# Altium schematic symbol library Analog Devices Data Converters Digital-to-Analog Converters.SchLib: 2231 symbols (part 108 of 135)
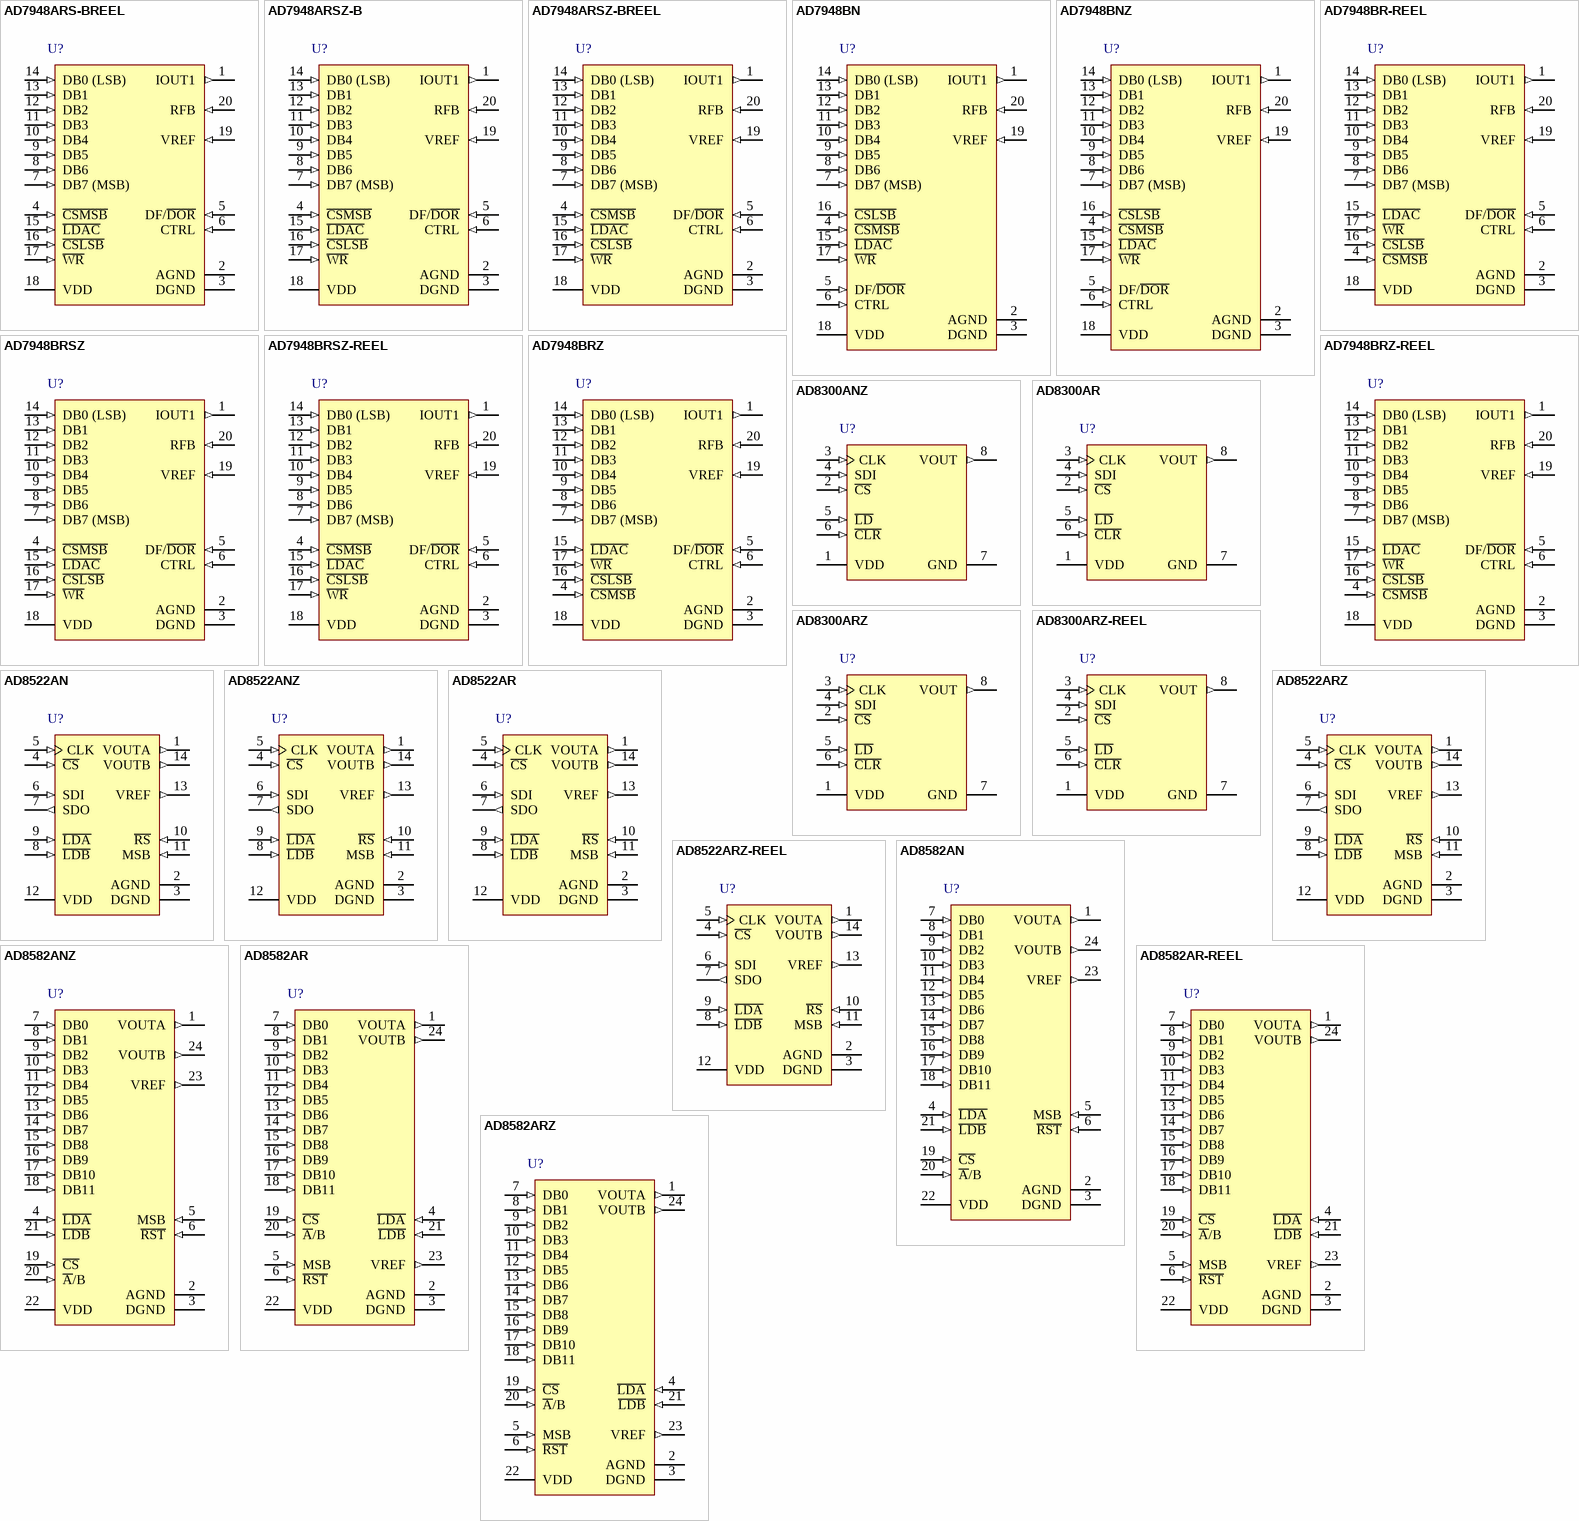
[diagram p220: symbols AD7948ARS-BREEL to AD8582ARZ]

## AD7948BRSZ-REEL
designator U?
Single 12-Bit Multiplying Digital-to-Analog Converter, 3.3 V / 5 V, -40 to +85 degC, RS-20, Pb-Free, Reel; Generic Part Number: AD7948; Manufacturer: Analog Devices; PartNumber: AD7948BRSZ-REEL; # DAC Outputs: 1; Max V+: 5.5V; Op Pwr Diss: 25µW; Resolution (Bits): 12; Settling Time: 600ns; Single Supply: Yes; DatasheetVersion: Rev.B; PackageVersion: Mar-2003; PackageReference: RS-20; PackageDescription: 20-Lead Shrink Small Outline Package [SSOP]; Supplier 1: Digi-Key; Supplier Part Number 1: AD7948BRSZ-REEL-ND; Supplier 2: Mouser; Supplier Part Number 2: 584-AD7948BRSZ-R; Packing: Reel; RoHS: Y; Mounting Technology: Surface Mount; Code_JEDEC: MO-150AE; ComponentLink1Description: Manufacturer URL; ComponentLink1URL: http://www.analog.com/en/index.html; ComponentLink2Description: Datasheet; ComponentLink2URL: http://www.analog.com/static/imported-files/data_sheets/AD7943_7945_7948.pdf; ComponentLink3Description: Package Specification; ComponentLink3URL: http://www.analog.com/static/imported-files/packages/318405805657546556503576154334802686596RS_20.pdf; ComponentLink4Description: Product URL; ComponentLink4URL: http://www.analog.com/en/digital-to-analog-converters/da-converters/ad7948/products/product.html
footprint RS-20_N (SOP, 20-Leads, Body 7.2x5.3mm, Pitch 0.65mm, IPC Medium Density)
footprint RS-20_L (SOP, 20-Leads, Body 7.2x5.3mm, Pitch 0.65mm, IPC High Density)
footprint RS-20_M (SOP, 20-Leads, Body 7.2x5.3mm, Pitch 0.65mm, IPC Low Density)
pins: 1 IOUT1 (out) "DAC current output terminal 1. Normally terminated at the virtual ground of output amplifier.", 2 AGND (power) "Analog Ground Pin. This pin connects to the back gates of the current steering switches. The DAC IOUT2 terminal is also connected internally to this point.", 3 DGND (power) "Digital Ground Pin.", 4 ~{CSMSB} (in) "Chip Select Most Significant Byte. Active Low Input. Used in combination with W\R\ to load external data into the input register or in combination with L\D\A\C\ and W\R\ to load external data into both input and DAC (See Datasheet)", 5 DF/~{DOR} (in) "Data Format/Data Override. When this input is low, data in the DAC register is forced to one of two override codes selected by CTRL. When the override signal is removed, the DAC output returns to reflect the value in the DAC (See Datasheet)", 6 CTRL (in) "Control Input. See DF/D\O\R\ description.", 7 DB7 (MSB) (in) "Digital Data Input", 8 DB6 (in) "Digital Data Input", 9 DB5 (in) "Digital Data Input", 10 DB4 (in) "Digital Data Input", 11 DB3 (in) "Digital Data Input", 12 DB2 (in) "Digital Data Input", 13 DB1 (in) "Digital Data Input", 14 DB0 (LSB) (in) "Digital Data Input", 15 ~{LDAC} (in) "Load DAC input, active low. This signal, in combination with others, is used to load the DAC register from either the input register or the external data bus.", 16 ~{CSLSB} (in) "Chip Select Least Significant (LS) Byte. Active Low Input. Used in combination with W\R\ to load external data into the input register or in combination with W\R\ and L\D\A\C\ to load external data into both input and DAC (See Datasheet)", 17 ~{WR} (in) "Write input, active low. This active low signal, in combination with others is used in loading external data into the AD7948 input register and in transferring data from the input register to the DAC register.", 18 VDD (power) "Power supply input. This is nominally +5 V for Normal Mode Operation and +3.3 V to +5 V for Biased Mode Operation.", 19 VREF (in) "DAC reference input.", 20 RFB (in) "DAC feedback resistor pin."

## AD7948BRZ
designator U?
Single 12-Bit Multiplying Digital-to-Analog Converter, 3.3 V / 5 V, -40 to +85 degC, RW-20, Pb-Free, Tube; Generic Part Number: AD7948; Manufacturer: Analog Devices; PartNumber: AD7948BRZ; # DAC Outputs: 1; Max V+: 5.5V; Op Pwr Diss: 25µW; Resolution (Bits): 12; Settling Time: 600ns; Single Supply: Yes; DatasheetVersion: Rev.B; PackageVersion: 060706-A; PackageReference: RW-20; PackageDescription: 20-Lead Standard Small Outline Package [SOIC_W] Wide Body; Supplier 1: Digi-Key; Supplier Part Number 1: AD7948BRZ-ND; Supplier 2: Newark; Supplier Part Number 2: 59K6083; Supplier 3: Mouser; Supplier Part Number 3: 584-AD7948BRZ; Packing: Tube; RoHS: Y; Mounting Technology: Surface Mount; Code_JEDEC: MS-013-AC; ComponentLink1Description: Manufacturer URL; ComponentLink1URL: http://www.analog.com/en/index.html; ComponentLink2Description: Datasheet; ComponentLink2URL: http://www.analog.com/static/imported-files/data_sheets/AD7943_7945_7948.pdf; ComponentLink3Description: Package Specification; ComponentLink3URL: http://www.analog.com/static/imported-files/packages/233848RW_20.pdf; ComponentLink4Description: Product URL; ComponentLink4URL: http://www.analog.com/en/digital-to-analog-converters/da-converters/ad7948/products/product.html
footprint RW-20_N (SOIC, 20-Leads, Body 12.8x7.5mm, Pitch 1.27mm, IPC Medium Density)
footprint RW-20_L (SOIC, 20-Leads, Body 12.8x7.5mm, Pitch 1.27mm, IPC High Density)
footprint RW-20_M (SOIC, 20-Leads, Body 12.8x7.5mm, Pitch 1.27mm, IPC Low Density)
pins: 1 IOUT1 (out) "DAC current output terminal 1. Normally terminated at the virtual ground of output amplifier.", 2 AGND (power) "Analog Ground Pin. This pin connects to the back gates of the current steering switches. The DAC IOUT2 terminal is also connected internally to this point.", 3 DGND (power) "Digital Ground Pin.", 4 ~{CSMSB} (in) "Chip Select Most Significant Byte. Active Low Input. Used in combination with W\R\ to load external data into the input register or in combination with L\D\A\C\ and W\R\ to load external data into both input and DAC (See Datasheet)", 5 DF/~{DOR} (in) "Data Format/Data Override. When this input is low, data in the DAC register is forced to one of two override codes selected by CTRL. When the override signal is removed, the DAC output returns to reflect the value in the DAC (See Datasheet)", 6 CTRL (in) "Control Input. See DF/D\O\R\ description.", 7 DB7 (MSB) (in) "Digital Data Input", 8 DB6 (in) "Digital Data Input", 9 DB5 (in) "Digital Data Input", 10 DB4 (in) "Digital Data Input", 11 DB3 (in) "Digital Data Input", 12 DB2 (in) "Digital Data Input", 13 DB1 (in) "Digital Data Input", 14 DB0 (LSB) (in) "Digital Data Input", 15 ~{LDAC} (in) "Load DAC input, active low. This signal, in combination with others, is used to load the DAC register from either the input register or the external data bus.", 16 ~{CSLSB} (in) "Chip Select Least Significant (LS) Byte. Active Low Input. Used in combination with W\R\ to load external data into the input register or in combination with W\R\ and L\D\A\C\ to load external data into both input and DAC (See Datasheet)", 17 ~{WR} (in) "Write input, active low. This active low signal, in combination with others is used in loading external data into the AD7948 input register and in transferring data from the input register to the DAC register.", 18 VDD (power) "Power supply input. This is nominally +5 V for Normal Mode Operation and +3.3 V to +5 V for Biased Mode Operation.", 19 VREF (in) "DAC reference input.", 20 RFB (in) "DAC feedback resistor pin."

## AD7948BRZ-REEL
designator U?
Single 12-Bit Multiplying Digital-to-Analog Converter, 3.3 V / 5 V, -40 to +85 degC, RW-20, Pb-Free, Reel; Generic Part Number: AD7948; Manufacturer: Analog Devices; PartNumber: AD7948BRZ-REEL; # DAC Outputs: 1; Max V+: 5.5V; Op Pwr Diss: 25µW; Resolution (Bits): 12; Settling Time: 600ns; Single Supply: Yes; DatasheetVersion: Rev.B; PackageVersion: 060706-A; PackageReference: RW-20; PackageDescription: 20-Lead Standard Small Outline Package [SOIC_W] Wide Body; Supplier 1: Digi-Key; Supplier Part Number 1: AD7948BRZ-REEL-ND; Supplier 2: Mouser; Supplier Part Number 2: 584-AD7948BRZ-R; Packing: Reel; RoHS: Y; Mounting Technology: Surface Mount; Code_JEDEC: MS-013-AC; ComponentLink1Description: Manufacturer URL; ComponentLink1URL: http://www.analog.com/en/index.html; ComponentLink2Description: Datasheet; ComponentLink2URL: http://www.analog.com/static/imported-files/data_sheets/AD7943_7945_7948.pdf; ComponentLink3Description: Package Specification; ComponentLink3URL: http://www.analog.com/static/imported-files/packages/233848RW_20.pdf; ComponentLink4Description: Product URL; ComponentLink4URL: http://www.analog.com/en/digital-to-analog-converters/da-converters/ad7948/products/product.html
footprint RW-20_N (SOIC, 20-Leads, Body 12.8x7.5mm, Pitch 1.27mm, IPC Medium Density)
footprint RW-20_L (SOIC, 20-Leads, Body 12.8x7.5mm, Pitch 1.27mm, IPC High Density)
footprint RW-20_M (SOIC, 20-Leads, Body 12.8x7.5mm, Pitch 1.27mm, IPC Low Density)
pins: 1 IOUT1 (out) "DAC current output terminal 1. Normally terminated at the virtual ground of output amplifier.", 2 AGND (power) "Analog Ground Pin. This pin connects to the back gates of the current steering switches. The DAC IOUT2 terminal is also connected internally to this point.", 3 DGND (power) "Digital Ground Pin.", 4 ~{CSMSB} (in) "Chip Select Most Significant Byte. Active Low Input. Used in combination with W\R\ to load external data into the input register or in combination with L\D\A\C\ and W\R\ to load external data into both input and DAC (See Datasheet)", 5 DF/~{DOR} (in) "Data Format/Data Override. When this input is low, data in the DAC register is forced to one of two override codes selected by CTRL. When the override signal is removed, the DAC output returns to reflect the value in the DAC (See Datasheet)", 6 CTRL (in) "Control Input. See DF/D\O\R\ description.", 7 DB7 (MSB) (in) "Digital Data Input", 8 DB6 (in) "Digital Data Input", 9 DB5 (in) "Digital Data Input", 10 DB4 (in) "Digital Data Input", 11 DB3 (in) "Digital Data Input", 12 DB2 (in) "Digital Data Input", 13 DB1 (in) "Digital Data Input", 14 DB0 (LSB) (in) "Digital Data Input", 15 ~{LDAC} (in) "Load DAC input, active low. This signal, in combination with others, is used to load the DAC register from either the input register or the external data bus.", 16 ~{CSLSB} (in) "Chip Select Least Significant (LS) Byte. Active Low Input. Used in combination with W\R\ to load external data into the input register or in combination with W\R\ and L\D\A\C\ to load external data into both input and DAC (See Datasheet)", 17 ~{WR} (in) "Write input, active low. This active low signal, in combination with others is used in loading external data into the AD7948 input register and in transferring data from the input register to the DAC register.", 18 VDD (power) "Power supply input. This is nominally +5 V for Normal Mode Operation and +3.3 V to +5 V for Biased Mode Operation.", 19 VREF (in) "DAC reference input.", 20 RFB (in) "DAC feedback resistor pin."

## AD8300ANZ
designator U?
Single 12-Bit Digital-to-Analog Converter with Serial Interface, 3 V, -40 to +85 degC, N-8, Pb-Free, Tube; Generic Part Number: AD8300; Manufacturer: Analog Devices; PartNumber: AD8300ANZ; # DAC Outputs: 1; Max V+: 5.5V; Op Pwr Diss: 8.5mW; Resolution (Bits): 12; Settling Time: 14µs; Single Supply: Yes; DatasheetVersion: Rev.A; PackageVersion: 070606-A; PackageReference: N-8; PackageDescription: 8-Lead Plastic Dual In-Line Package [PDIP] Narrow Body; Supplier 1: Digi-Key; Supplier Part Number 1: AD8300ANZ-ND; Supplier 2: Mouser; Supplier Part Number 2: 584-AD8300ANZ; Packing: Tube; RoHS: Y; Mounting Technology: Through Hole; Code_JEDEC: MS-001; ComponentLink1Description: Manufacturer URL; ComponentLink1URL: http://www.analog.com/en/index.html; ComponentLink2Description: Datasheet; ComponentLink2URL: http://www.analog.com/static/imported-files/data_sheets/AD8300.pdf; ComponentLink3Description: Package Specification; ComponentLink3URL: http://www.analog.com/static/imported-files/packages/PKG_PDF/PDIP(N)/N_8.pdf; ComponentLink4Description: Product URL; ComponentLink4URL: http://www.analog.com/en/digital-to-analog-converters/da-converters/ad8300/products/product.html
footprint N-8 (DIP, 8-Leads, Row Spacing 7.62mm, Pitch 2.54mm, Body 9.6x6.6mm)
pins: 1 VDD (power) "Positive power supply input. Specified range of operation +2.7 V to +5.5 V.", 2 ~{CS} (in) "Chip Select, active low input. Disables shift register loading when high. Does not affect L\D\ operation.", 3 CLK (in) "Clock input, positive edge clocks data into shift register.", 4 SDI (in) "Serial Data Input, input data loads directly into the shift register, MSB first.", 5 ~{LD} (in) "Load DAC register strobes, active low. Transfers shift register data to DAC register. See Truth Table I for operation. Asynchronous active low input.", 6 ~{CLR} (in) "Resets DAC register to zero condition. Asynchronous active low input.", 7 GND (power) "Analog and Digital Ground.", 8 VOUT (out) "DAC voltage output, 2.0475 V full scale with 0.5 mV per bit. An internal temperature stabilized reference maintains a fixed full-scale voltage independent of time, temperature and power supply variations."

## AD8300AR
designator U?
Single 12-Bit Digital-to-Analog Converter with Serial Interface, 3 V, -40 to +85 degC, R-8, Tube; Generic Part Number: AD8300; Manufacturer: Analog Devices; PartNumber: AD8300AR; # DAC Outputs: 1; Max V+: 5.5V; Op Pwr Diss: 8.5mW; Resolution (Bits): 12; Settling Time: 14µs; Single Supply: Yes; DatasheetVersion: Rev.A; PackageVersion: 060506-A; PackageReference: R-8; PackageDescription: 8-Lead Standard Small Outline Package [SOIC_N] Narrow Body; Supplier 1: Digi-Key; Supplier Part Number 1: AD8300AR-ND; Supplier 2: Mouser; Supplier Part Number 2: 584-AD8300AR; Packing: Tube; RoHS: N; Mounting Technology: Surface Mount; Code_JEDEC: MS-012-AA; Code_IPC: SOIC127P600-8; ComponentLink1Description: Manufacturer URL; ComponentLink1URL: http://www.analog.com/en/index.html; ComponentLink2Description: Datasheet; ComponentLink2URL: http://www.analog.com/static/imported-files/data_sheets/AD8300.pdf; ComponentLink3Description: Package Specification; ComponentLink3URL: http://www.analog.com/static/imported-files/packages/PKG_PDF/SOIC_Narrow%20(R)/R_8.pdf; ComponentLink4Description: Product URL; ComponentLink4URL: http://www.analog.com/en/digital-to-analog-converters/da-converters/ad8300/products/product.html
footprint R-8_N (SOIC, 8-Leads, Body 4.9x3.9mm, Pitch 1.27mm, IPC Medium Density)
footprint R-8_L (SOIC, 8-Leads, Body 4.9x3.9mm, Pitch 1.27mm, IPC High Density)
footprint R-8_M (SOIC, 8-Leads, Body 4.9x3.9mm, Pitch 1.27mm, IPC Low Density)
pins: 1 VDD (power) "Positive power supply input. Specified range of operation +2.7 V to +5.5 V.", 2 ~{CS} (in) "Chip Select, active low input. Disables shift register loading when high. Does not affect L\D\ operation.", 3 CLK (in) "Clock input, positive edge clocks data into shift register.", 4 SDI (in) "Serial Data Input, input data loads directly into the shift register, MSB first.", 5 ~{LD} (in) "Load DAC register strobes, active low. Transfers shift register data to DAC register. See Truth Table I for operation. Asynchronous active low input.", 6 ~{CLR} (in) "Resets DAC register to zero condition. Asynchronous active low input.", 7 GND (power) "Analog and Digital Ground.", 8 VOUT (out) "DAC voltage output, 2.0475 V full scale with 0.5 mV per bit. An internal temperature stabilized reference maintains a fixed full-scale voltage independent of time, temperature and power supply variations."

## AD8300ARZ
designator U?
Single 12-Bit Digital-to-Analog Converter with Serial Interface, 3 V, -40 to +85 degC, R-8, Pb-Free, Tube; Generic Part Number: AD8300; Manufacturer: Analog Devices; PartNumber: AD8300ARZ; # DAC Outputs: 1; Max V+: 5.5V; Op Pwr Diss: 8.5mW; Resolution (Bits): 12; Settling Time: 14µs; Single Supply: Yes; DatasheetVersion: Rev.A; PackageVersion: 060506-A; PackageReference: R-8; PackageDescription: 8-Lead Standard Small Outline Package [SOIC_N] Narrow Body; Supplier 1: Digi-Key; Supplier Part Number 1: AD8300ARZ-ND; Supplier 2: Farnell; Supplier Part Number 2: 1438629; Supplier 3: Newark; Supplier Part Number 3: 59K6546; Supplier 4: Mouser; Supplier Part Number 4: 584-AD8300ARZ; Packing: Tube; RoHS: Y; Mounting Technology: Surface Mount; Code_JEDEC: MS-012-AA; Code_IPC: SOIC127P600-8; ComponentLink1Description: Manufacturer URL; ComponentLink1URL: http://www.analog.com/en/index.html; ComponentLink2Description: Datasheet; ComponentLink2URL: http://www.analog.com/static/imported-files/data_sheets/AD8300.pdf; ComponentLink3Description: Package Specification; ComponentLink3URL: http://www.analog.com/static/imported-files/packages/PKG_PDF/SOIC_Narrow%20(R)/R_8.pdf; ComponentLink4Description: Product URL; ComponentLink4URL: http://www.analog.com/en/digital-to-analog-converters/da-converters/ad8300/products/product.html
footprint R-8_N (SOIC, 8-Leads, Body 4.9x3.9mm, Pitch 1.27mm, IPC Medium Density)
footprint R-8_L (SOIC, 8-Leads, Body 4.9x3.9mm, Pitch 1.27mm, IPC High Density)
footprint R-8_M (SOIC, 8-Leads, Body 4.9x3.9mm, Pitch 1.27mm, IPC Low Density)
pins: 1 VDD (power) "Positive power supply input. Specified range of operation +2.7 V to +5.5 V.", 2 ~{CS} (in) "Chip Select, active low input. Disables shift register loading when high. Does not affect L\D\ operation.", 3 CLK (in) "Clock input, positive edge clocks data into shift register.", 4 SDI (in) "Serial Data Input, input data loads directly into the shift register, MSB first.", 5 ~{LD} (in) "Load DAC register strobes, active low. Transfers shift register data to DAC register. See Truth Table I for operation. Asynchronous active low input.", 6 ~{CLR} (in) "Resets DAC register to zero condition. Asynchronous active low input.", 7 GND (power) "Analog and Digital Ground.", 8 VOUT (out) "DAC voltage output, 2.0475 V full scale with 0.5 mV per bit. An internal temperature stabilized reference maintains a fixed full-scale voltage independent of time, temperature and power supply variations."

## AD8300ARZ-REEL
designator U?
Single 12-Bit Digital-to-Analog Converter with Serial Interface, 3 V, -40 to +85 degC, R-8, Pb-Free, Reel; Generic Part Number: AD8300; Manufacturer: Analog Devices; PartNumber: AD8300ARZ-REEL; # DAC Outputs: 1; Max V+: 5.5V; Op Pwr Diss: 8.5mW; Resolution (Bits): 12; Settling Time: 14µs; Single Supply: Yes; DatasheetVersion: Rev.A; PackageVersion: 060506-A; PackageReference: R-8; PackageDescription: 8-Lead Standard Small Outline Package [SOIC_N] Narrow Body; Supplier 1: Digi-Key; Supplier Part Number 1: AD8300ARZ-REEL-ND; Supplier 2: Mouser; Supplier Part Number 2: 584-AD8300ARZ-R; Packing: Reel; RoHS: Y; Mounting Technology: Surface Mount; Code_JEDEC: MS-012-AA; Code_IPC: SOIC127P600-8; ComponentLink1Description: Manufacturer URL; ComponentLink1URL: http://www.analog.com/en/index.html; ComponentLink2Description: Datasheet; ComponentLink2URL: http://www.analog.com/static/imported-files/data_sheets/AD8300.pdf; ComponentLink3Description: Package Specification; ComponentLink3URL: http://www.analog.com/static/imported-files/packages/PKG_PDF/SOIC_Narrow%20(R)/R_8.pdf; ComponentLink4Description: Product URL; ComponentLink4URL: http://www.analog.com/en/digital-to-analog-converters/da-converters/ad8300/products/product.html
footprint R-8_N (SOIC, 8-Leads, Body 4.9x3.9mm, Pitch 1.27mm, IPC Medium Density)
footprint R-8_L (SOIC, 8-Leads, Body 4.9x3.9mm, Pitch 1.27mm, IPC High Density)
footprint R-8_M (SOIC, 8-Leads, Body 4.9x3.9mm, Pitch 1.27mm, IPC Low Density)
pins: 1 VDD (power) "Positive power supply input. Specified range of operation +2.7 V to +5.5 V.", 2 ~{CS} (in) "Chip Select, active low input. Disables shift register loading when high. Does not affect L\D\ operation.", 3 CLK (in) "Clock input, positive edge clocks data into shift register.", 4 SDI (in) "Serial Data Input, input data loads directly into the shift register, MSB first.", 5 ~{LD} (in) "Load DAC register strobes, active low. Transfers shift register data to DAC register. See Truth Table I for operation. Asynchronous active low input.", 6 ~{CLR} (in) "Resets DAC register to zero condition. Asynchronous active low input.", 7 GND (power) "Analog and Digital Ground.", 8 VOUT (out) "DAC voltage output, 2.0475 V full scale with 0.5 mV per bit. An internal temperature stabilized reference maintains a fixed full-scale voltage independent of time, temperature and power supply variations."

## AD8522AN
designator U?
Dual 12-Bit Digital-to-Analog Converter with Serial Interface, 5 V, -40 to +85 degC, N-14, Tube; Generic Part Number: AD8522; Manufacturer: Analog Devices; PartNumber: AD8522AN; # DAC Outputs: 2; Max V+: 5.5V; Op Pwr Diss: 25mW; Resolution (Bits): 12; Settling Time: 16µs; Single Supply: Yes; DatasheetVersion: Rev.A; PackageVersion: 070606-A; PackageReference: N-14; PackageDescription: 14-Lead Plastic Dual In-Line Package [PDIP] Narrow Body; Supplier 1: Digi-Key; Supplier Part Number 1: AD8522AN-ND; Supplier 2: Newark; Supplier Part Number 2: 66F5918; Supplier 3: Mouser; Supplier Part Number 3: 584-AD8522AN; Packing: Tube; RoHS: N; Mounting Technology: Through Hole; Code_JEDEC: MS-001; ComponentLink1Description: Manufacturer URL; ComponentLink1URL: http://www.analog.com/en/index.html; ComponentLink2Description: Datasheet; ComponentLink2URL: http://www.analog.com/static/imported-files/data_sheets/AD8522.pdf; ComponentLink3Description: Package Specification; ComponentLink3URL: http://www.analog.com/static/imported-files/packages/N_14.pdf; ComponentLink4Description: Product URL; ComponentLink4URL: http://www.analog.com/en/digital-to-analog-converters/da-converters/ad8522/products/product.html
footprint N-14 (DIP, 14-Leads, Row Spacing 7.62mm, Pitch 2.54mm, Body 19.2x6.6mm)
pins: 1 VOUTA (out) "DAC A voltage outputs, 4.095 V full scale, +/-5 mA output.", 2 AGND (power) "Analog Ground Input.", 3 DGND (power) "Digital Ground Input.", 4 ~{CS} (in) "Chip Select, active low input. Prevents shift register loading when high. Does not affect L\D\A\ and L\D\B\ operation.", 5 CLK (in) "Clock input, positive edge clocks data into shift register.", 6 SDI (in) "Serial Data Input, input data loads directly into the shift register.", 7 SDO (out) "Serial Data Output. Output of shift register, always active.", 8 ~{LDB} (in) "Load DAC register strobes, active low. Transfers shift register data to DAC register. See truth table for operation.Software decode feature only requires one L\D\ strobe. Tie L\D\A\ and L\D\B\ together or use one of them (See Datasheet)", 9 ~{LDA} (in) "Load DAC register strobes, active low. Transfers shift register data to DAC register. See truth table for operation.Software decode feature only requires one L\D\ strobe. Tie L\D\A\ and L\D\B\ together or use one of them (See Datasheet)", 10 ~{RS} (in) "Resets DAC registers to condition determined by MSB pin. Active low input.", 11 MSB (in) "Digital input: High presets DAC registers to half scale (800H); Low clears all registers to zero (000H), when R\S\ is strobed to active low.", 12 VDD (power) "Positive +5 V power supply input. Tolerance +/-10%.", 13 VREF (out) "Reference Voltage Output, 2.5 V nominal.", 14 VOUTB (out) "DAC B voltage outputs, 4.095 V full scale, +/-5 mA output."

## AD8522ANZ
designator U?
Dual 12-Bit Digital-to-Analog Converter with Serial Interface, 5 V, -40 to +85 degC, N-14, Pb-Free, Tube; Generic Part Number: AD8522; Manufacturer: Analog Devices; PartNumber: AD8522ANZ; # DAC Outputs: 2; Max V+: 5.5V; Op Pwr Diss: 25mW; Resolution (Bits): 12; Settling Time: 16µs; Single Supply: Yes; DatasheetVersion: Rev.A; PackageVersion: 070606-A; PackageReference: N-14; PackageDescription: 14-Lead Plastic Dual In-Line Package [PDIP] Narrow Body; Supplier 1: Digi-Key; Supplier Part Number 1: AD8522ANZ-ND; Supplier 2: Mouser; Supplier Part Number 2: 584-AD8522ANZ; Packing: Tube; RoHS: Y; Mounting Technology: Through Hole; Code_JEDEC: MS-001; ComponentLink1Description: Manufacturer URL; ComponentLink1URL: http://www.analog.com/en/index.html; ComponentLink2Description: Datasheet; ComponentLink2URL: http://www.analog.com/static/imported-files/data_sheets/AD8522.pdf; ComponentLink3Description: Package Specification; ComponentLink3URL: http://www.analog.com/static/imported-files/packages/N_14.pdf; ComponentLink4Description: Product URL; ComponentLink4URL: http://www.analog.com/en/digital-to-analog-converters/da-converters/ad8522/products/product.html
footprint N-14 (DIP, 14-Leads, Row Spacing 7.62mm, Pitch 2.54mm, Body 19.2x6.6mm)
pins: 1 VOUTA (out) "DAC A voltage outputs, 4.095 V full scale, +/-5 mA output.", 2 AGND (power) "Analog Ground Input.", 3 DGND (power) "Digital Ground Input.", 4 ~{CS} (in) "Chip Select, active low input. Prevents shift register loading when high. Does not affect L\D\A\ and L\D\B\ operation.", 5 CLK (in) "Clock input, positive edge clocks data into shift register.", 6 SDI (in) "Serial Data Input, input data loads directly into the shift register.", 7 SDO (out) "Serial Data Output. Output of shift register, always active.", 8 ~{LDB} (in) "Load DAC register strobes, active low. Transfers shift register data to DAC register. See truth table for operation.Software decode feature only requires one L\D\ strobe. Tie L\D\A\ and L\D\B\ together or use one of them (See Datasheet)", 9 ~{LDA} (in) "Load DAC register strobes, active low. Transfers shift register data to DAC register. See truth table for operation.Software decode feature only requires one L\D\ strobe. Tie L\D\A\ and L\D\B\ together or use one of them (See Datasheet)", 10 ~{RS} (in) "Resets DAC registers to condition determined by MSB pin. Active low input.", 11 MSB (in) "Digital input: High presets DAC registers to half scale (800H); Low clears all registers to zero (000H), when R\S\ is strobed to active low.", 12 VDD (power) "Positive +5 V power supply input. Tolerance +/-10%.", 13 VREF (out) "Reference Voltage Output, 2.5 V nominal.", 14 VOUTB (out) "DAC B voltage outputs, 4.095 V full scale, +/-5 mA output."

## AD8522AR
designator U?
Dual 12-Bit Digital-to-Analog Converter with Serial Interface, 5 V, -40 to +85 degC, R-14, Tube; Generic Part Number: AD8522; Manufacturer: Analog Devices; PartNumber: AD8522AR; # DAC Outputs: 2; Max V+: 5.5V; Op Pwr Diss: 25mW; Resolution (Bits): 12; Settling Time: 16µs; Single Supply: Yes; DatasheetVersion: Rev.A; PackageVersion: 060606-A; PackageReference: R-14; PackageDescription: 14-Lead Standard Small Outline Package [SOIC_N]; Supplier 1: Digi-Key; Supplier Part Number 1: AD8522AR-ND; Supplier 2: Mouser; Supplier Part Number 2: 584-AD8522AR; Packing: Tube; RoHS: N; Mounting Technology: Surface Mount; Code_JEDEC: MS-012-AB; Code_IPC: SOIC127P600-14; ComponentLink1Description: Manufacturer URL; ComponentLink1URL: http://www.analog.com/en/index.html; ComponentLink2Description: Datasheet; ComponentLink2URL: http://www.analog.com/static/imported-files/data_sheets/AD8522.pdf; ComponentLink3Description: Package Specification; ComponentLink3URL: http://www.analog.com/static/imported-files/packages/PKG_PDF/SOIC_Narrow%20(R)/R_14.pdf; ComponentLink4Description: Product URL; ComponentLink4URL: http://www.analog.com/en/digital-to-analog-converters/da-converters/ad8522/products/product.html
footprint R-14_N (SOIC, 14-Leads, Body 8.7x3.9mm, Pitch 1.27mm, IPC Medium Density)
footprint R-14_L (SOIC, 14-Leads, Body 8.7x3.9mm, Pitch 1.27mm, IPC High Density)
footprint R-14_M (SOIC, 14-Leads, Body 8.7x3.9mm, Pitch 1.27mm, IPC Low Density)
pins: 1 VOUTA (out) "DAC A voltage outputs, 4.095 V full scale, +/-5 mA output.", 2 AGND (power) "Analog Ground Input.", 3 DGND (power) "Digital Ground Input.", 4 ~{CS} (in) "Chip Select, active low input. Prevents shift register loading when high. Does not affect L\D\A\ and L\D\B\ operation.", 5 CLK (in) "Clock input, positive edge clocks data into shift register.", 6 SDI (in) "Serial Data Input, input data loads directly into the shift register.", 7 SDO (out) "Serial Data Output. Output of shift register, always active.", 8 ~{LDB} (in) "Load DAC register strobes, active low. Transfers shift register data to DAC register. See truth table for operation.Software decode feature only requires one L\D\ strobe. Tie L\D\A\ and L\D\B\ together or use one of them (See Datasheet)", 9 ~{LDA} (in) "Load DAC register strobes, active low. Transfers shift register data to DAC register. See truth table for operation.Software decode feature only requires one L\D\ strobe. Tie L\D\A\ and L\D\B\ together or use one of them (See Datasheet)", 10 ~{RS} (in) "Resets DAC registers to condition determined by MSB pin. Active low input.", 11 MSB (in) "Digital input: High presets DAC registers to half scale (800H); Low clears all registers to zero (000H), when R\S\ is strobed to active low.", 12 VDD (power) "Positive +5 V power supply input. Tolerance +/-10%.", 13 VREF (out) "Reference Voltage Output, 2.5 V nominal.", 14 VOUTB (out) "DAC B voltage outputs, 4.095 V full scale, +/-5 mA output."

## AD8522ARZ
designator U?
Dual 12-Bit Digital-to-Analog Converter with Serial Interface, 5 V, -40 to +85 degC, R-14, Pb-Free, Tube; Generic Part Number: AD8522; Manufacturer: Analog Devices; PartNumber: AD8522ARZ; # DAC Outputs: 2; Max V+: 5.5V; Op Pwr Diss: 25mW; Resolution (Bits): 12; Settling Time: 16µs; Single Supply: Yes; DatasheetVersion: Rev.A; PackageVersion: 060606-A; PackageReference: R-14; PackageDescription: 14-Lead Standard Small Outline Package [SOIC_N]; Supplier 1: Digi-Key; Supplier Part Number 1: AD8522ARZ-ND; Supplier 2: Farnell; Supplier Part Number 2: 2305694; Supplier 3: Newark; Supplier Part Number 3: 59K6799; Supplier 4: Mouser; Supplier Part Number 4: 584-AD8522ARZ; Packing: Tube; RoHS: Y; Mounting Technology: Surface Mount; Code_JEDEC: MS-012-AB; Code_IPC: SOIC127P600-14; ComponentLink1Description: Manufacturer URL; ComponentLink1URL: http://www.analog.com/en/index.html; ComponentLink2Description: Datasheet; ComponentLink2URL: http://www.analog.com/static/imported-files/data_sheets/AD8522.pdf; ComponentLink3Description: Package Specification; ComponentLink3URL: http://www.analog.com/static/imported-files/packages/PKG_PDF/SOIC_Narrow%20(R)/R_14.pdf; ComponentLink4Description: Product URL; ComponentLink4URL: http://www.analog.com/en/digital-to-analog-converters/da-converters/ad8522/products/product.html
footprint R-14_N (SOIC, 14-Leads, Body 8.7x3.9mm, Pitch 1.27mm, IPC Medium Density)
footprint R-14_L (SOIC, 14-Leads, Body 8.7x3.9mm, Pitch 1.27mm, IPC High Density)
footprint R-14_M (SOIC, 14-Leads, Body 8.7x3.9mm, Pitch 1.27mm, IPC Low Density)
pins: 1 VOUTA (out) "DAC A voltage outputs, 4.095 V full scale, +/-5 mA output.", 2 AGND (power) "Analog Ground Input.", 3 DGND (power) "Digital Ground Input.", 4 ~{CS} (in) "Chip Select, active low input. Prevents shift register loading when high. Does not affect L\D\A\ and L\D\B\ operation.", 5 CLK (in) "Clock input, positive edge clocks data into shift register.", 6 SDI (in) "Serial Data Input, input data loads directly into the shift register.", 7 SDO (out) "Serial Data Output. Output of shift register, always active.", 8 ~{LDB} (in) "Load DAC register strobes, active low. Transfers shift register data to DAC register. See truth table for operation.Software decode feature only requires one L\D\ strobe. Tie L\D\A\ and L\D\B\ together or use one of them (See Datasheet)", 9 ~{LDA} (in) "Load DAC register strobes, active low. Transfers shift register data to DAC register. See truth table for operation.Software decode feature only requires one L\D\ strobe. Tie L\D\A\ and L\D\B\ together or use one of them (See Datasheet)", 10 ~{RS} (in) "Resets DAC registers to condition determined by MSB pin. Active low input.", 11 MSB (in) "Digital input: High presets DAC registers to half scale (800H); Low clears all registers to zero (000H), when R\S\ is strobed to active low.", 12 VDD (power) "Positive +5 V power supply input. Tolerance +/-10%.", 13 VREF (out) "Reference Voltage Output, 2.5 V nominal.", 14 VOUTB (out) "DAC B voltage outputs, 4.095 V full scale, +/-5 mA output."

## AD8522ARZ-REEL
designator U?
Dual 12-Bit Digital-to-Analog Converter with Serial Interface, 5 V, -40 to +85 degC, R-14, Pb-Free, Reel; Generic Part Number: AD8522; Manufacturer: Analog Devices; PartNumber: AD8522ARZ-REEL; # DAC Outputs: 2; Max V+: 5.5V; Op Pwr Diss: 25mW; Resolution (Bits): 12; Settling Time: 16µs; Single Supply: Yes; DatasheetVersion: Rev.A; PackageVersion: 060606-A; PackageReference: R-14; PackageDescription: 14-Lead Standard Small Outline Package [SOIC_N]; Supplier 1: Digi-Key; Supplier Part Number 1: AD8522ARZ-REEL-ND; Supplier 2: Mouser; Supplier Part Number 2: 584-AD8522ARZ-R; Packing: Reel; RoHS: Y; Mounting Technology: Surface Mount; Code_JEDEC: MS-012-AB; Code_IPC: SOIC127P600-14; ComponentLink1Description: Manufacturer URL; ComponentLink1URL: http://www.analog.com/en/index.html; ComponentLink2Description: Datasheet; ComponentLink2URL: http://www.analog.com/static/imported-files/data_sheets/AD8522.pdf; ComponentLink3Description: Package Specification; ComponentLink3URL: http://www.analog.com/static/imported-files/packages/PKG_PDF/SOIC_Narrow%20(R)/R_14.pdf; ComponentLink4Description: Product URL; ComponentLink4URL: http://www.analog.com/en/digital-to-analog-converters/da-converters/ad8522/products/product.html
footprint R-14_N (SOIC, 14-Leads, Body 8.7x3.9mm, Pitch 1.27mm, IPC Medium Density)
footprint R-14_L (SOIC, 14-Leads, Body 8.7x3.9mm, Pitch 1.27mm, IPC High Density)
footprint R-14_M (SOIC, 14-Leads, Body 8.7x3.9mm, Pitch 1.27mm, IPC Low Density)
pins: 1 VOUTA (out) "DAC A voltage outputs, 4.095 V full scale, +/-5 mA output.", 2 AGND (power) "Analog Ground Input.", 3 DGND (power) "Digital Ground Input.", 4 ~{CS} (in) "Chip Select, active low input. Prevents shift register loading when high. Does not affect L\D\A\ and L\D\B\ operation.", 5 CLK (in) "Clock input, positive edge clocks data into shift register.", 6 SDI (in) "Serial Data Input, input data loads directly into the shift register.", 7 SDO (out) "Serial Data Output. Output of shift register, always active.", 8 ~{LDB} (in) "Load DAC register strobes, active low. Transfers shift register data to DAC register. See truth table for operation.Software decode feature only requires one L\D\ strobe. Tie L\D\A\ and L\D\B\ together or use one of them (See Datasheet)", 9 ~{LDA} (in) "Load DAC register strobes, active low. Transfers shift register data to DAC register. See truth table for operation.Software decode feature only requires one L\D\ strobe. Tie L\D\A\ and L\D\B\ together or use one of them (See Datasheet)", 10 ~{RS} (in) "Resets DAC registers to condition determined by MSB pin. Active low input.", 11 MSB (in) "Digital input: High presets DAC registers to half scale (800H); Low clears all registers to zero (000H), when R\S\ is strobed to active low.", 12 VDD (power) "Positive +5 V power supply input. Tolerance +/-10%.", 13 VREF (out) "Reference Voltage Output, 2.5 V nominal.", 14 VOUTB (out) "DAC B voltage outputs, 4.095 V full scale, +/-5 mA output."
